# Altium footprint library 螺母.PcbLib: 137 footprints (part 9 of 9)
Each footprint in its own frame and in the unit in brackets; x right, y up, seen from the top. Pads: shape width x height; smd on the part's side, far side on the other; paste and mask are expansions set on the pad; w line width, h text height; cw(c..) or ccw(c..) is an arc to the next point about the centre after c.
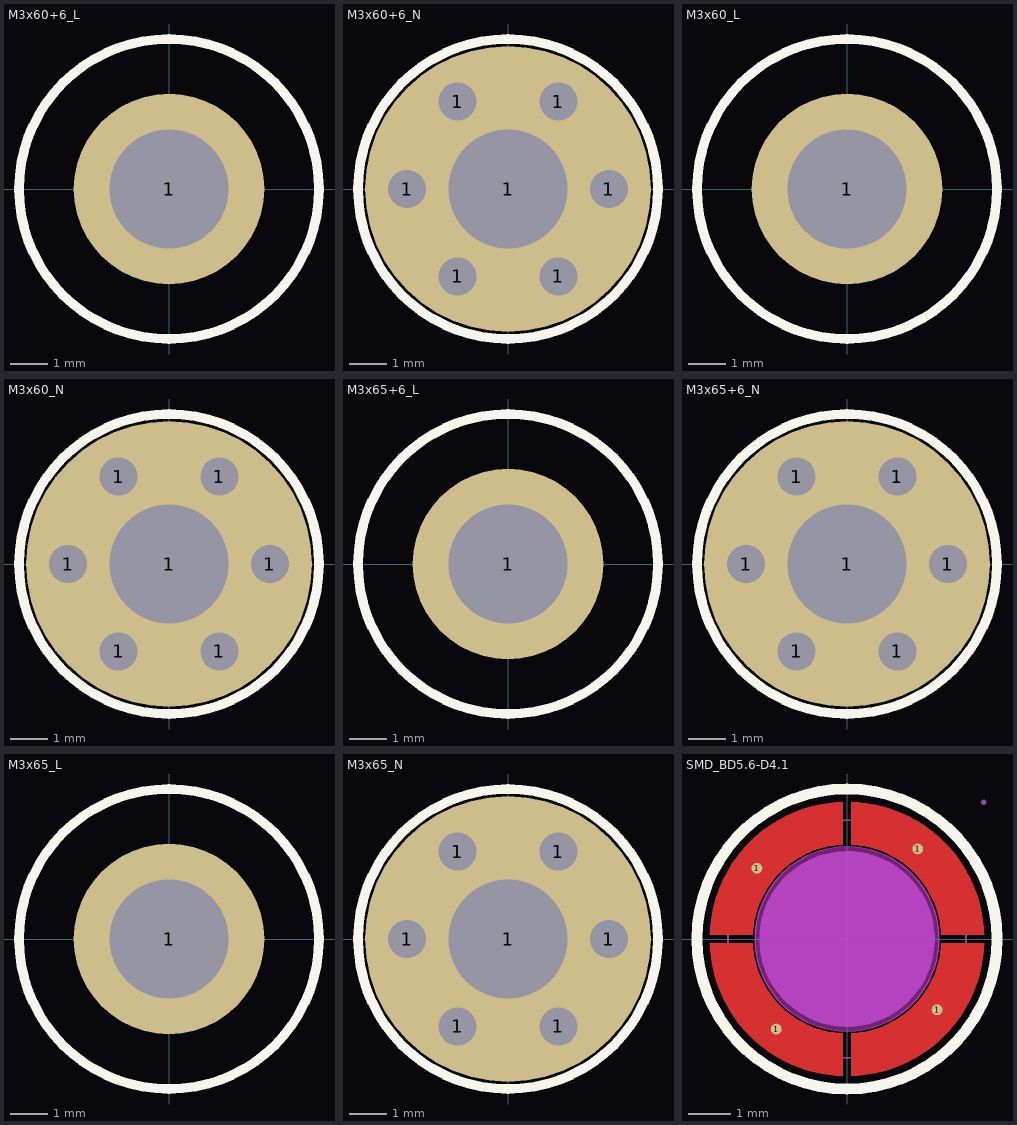
[diagram p8: the footprints below, top view; thin cyan lines are the x and y axes]

## M3x60+6_L [mil] "M3铜柱，长：60mm，螺纹长：6mm"
pads (1):
  round 200 hole 125: 1(0,0)
Top Overlay:
  circle w10: c0,0 r157.48
3D body "M3x60+6.STEP": height 2364.18, standoff -234.25, extent -106.22,-92.52 106.22,92.52

## M3x60+6_N [mil] "M3铜柱，长：60mm，螺纹长：6mm"
pads (7):
  round 40 hole 40: 1(-106,0) 1(-53,-91.8) 1(-53,91.8) 1(53,-91.8) 1(53,91.8) 1(106,0)
  round 300 hole 125: 1(0,0)
Top Overlay:
  circle w10: c0,0 r157.48
3D body "M3x60+6.STEP": height 2364.18, standoff -234.25, extent -106.22,-92.52 106.22,92.52

## M3x60_L [mil] "M3铜柱，长：60mm"
pads (1):
  round 200 hole 125: 1(0,0)
Top Overlay:
  circle w10: c0,0 r157.48
3D body "M3x60.STEP": height 2364.18, standoff 1.96, extent -106.22,-92.52 106.22,92.52

## M3x60_N [mil] "M3铜柱，长：60mm"
pads (7):
  round 40 hole 40: 1(-106,0) 1(-53,-91.8) 1(-53,91.8) 1(53,-91.8) 1(53,91.8) 1(106,0)
  round 300 hole 125: 1(0,0)
Top Overlay:
  circle w10: c0,0 r157.48
3D body "M3x60.STEP": height 2364.18, standoff 1.96, extent -106.22,-92.52 106.22,92.52

## M3x65+6_L [mil] "M3铜柱，长：65mm，螺纹长：6mm"
pads (1):
  round 200 hole 125: 1(0,0)
Top Overlay:
  circle w10: c0,0 r157.48
3D body "M3x65+6.STEP": height 2561.03, standoff -234.25, extent -106.22,-92.52 106.22,92.52

## M3x65+6_N [mil] "M3铜柱，长：65mm，螺纹长：6mm"
pads (7):
  round 40 hole 40: 1(-106,0) 1(-53,-91.8) 1(-53,91.8) 1(53,-91.8) 1(53,91.8) 1(106,0)
  round 300 hole 125: 1(0,0)
Top Overlay:
  circle w10: c0,0 r157.48
3D body "M3x65+6.STEP": height 2561.03, standoff -234.25, extent -106.22,-92.52 106.22,92.52

## M3x65_L [mil] "M3铜柱，长：65mm"
pads (1):
  round 200 hole 125: 1(0,0)
Top Overlay:
  circle w10: c0,0 r157.48
3D body "M3x65.STEP": height 2561.03, standoff 1.96, extent -106.22,-92.52 106.22,92.52

## M3x65_N [mil] "M3铜柱，长：65mm"
pads (7):
  round 40 hole 40: 1(-106,0) 1(-53,-91.8) 1(-53,91.8) 1(53,-91.8) 1(53,91.8) 1(106,0)
  round 300 hole 125: 1(0,0)
Top Overlay:
  circle w10: c0,0 r157.48
3D body "M3x65.STEP": height 2561.03, standoff 1.96, extent -106.22,-92.52 106.22,92.52

## SMD_BD5.6-D4.1 [mil]
pads (4):
  round 10 smd: 1(-82.75,64.96) 1(-64.96,-82.75) 1(64.96,82.75) 1(82.75,-64.96)
Top Layer:
  region: 3.94,-125.98 3.94,-86.61 6.61,-86.45 9.27,-86.21 11.92,-85.89 14.57,-85.48 17.2,-84.99 19.81,-84.42 22.4,-83.78 24.97,-83.05 27.52,-82.24 30.05,-81.35 32.54,-80.39 35,-79.35 37.43,-78.23 39.83,-77.04 42.18,-75.78 44.5,-74.44 46.77,-73.04 49,-71.56 51.19,-70.02 53.32,-68.41 55.4,-66.73 57.44,-64.99 59.41,-63.19 61.33,-61.33 63.19,-59.41 64.99,-57.44 66.73,-55.4 68.41,-53.32 70.02,-51.19 71.56,-49 73.04,-46.77 74.44,-44.5 75.78,-42.18 77.04,-39.83 78.23,-37.43 79.35,-35 80.39,-32.54 81.35,-30.05 82.24,-27.52 83.05,-24.97 83.78,-22.4 84.42,-19.81 84.99,-17.2 85.48,-14.57 85.89,-11.92 86.21,-9.27 86.45,-6.61 86.61,-3.94 125.98,-3.94 125.84,-7.16 125.62,-10.37 125.32,-13.58 124.93,-16.78 124.46,-19.97 123.91,-23.14 123.28,-26.3 122.57,-29.45 121.78,-32.57 120.91,-35.67 119.95,-38.75 118.93,-41.81 117.82,-44.83 116.64,-47.83 115.38,-50.8 114.04,-53.73 112.63,-56.63 111.15,-59.49 109.59,-62.31 107.96,-65.09 106.26,-67.83 104.5,-70.52 102.66,-73.17 100.76,-75.77 98.79,-78.32 96.75,-80.82 94.66,-83.27 92.5,-85.66 90.28,-88 88,-90.28 85.66,-92.5 83.27,-94.66 80.82,-96.75 78.32,-98.79 75.77,-100.76 73.17,-102.66 70.52,-104.5 67.83,-106.26 65.09,-107.96 62.31,-109.59 59.49,-111.15 56.63,-112.63 53.73,-114.04 50.8,-115.38 47.83,-116.64 44.83,-117.82 41.81,-118.93 38.75,-119.95 35.67,-120.91 32.57,-121.78 29.45,-122.57 26.3,-123.28 23.14,-123.91 19.97,-124.46 16.78,-124.93 13.58,-125.32 10.37,-125.62 7.16,-125.84
  region: -125.98,-3.94 -86.61,-3.94 -86.45,-6.61 -86.21,-9.27 -85.89,-11.92 -85.48,-14.57 -84.99,-17.2 -84.42,-19.81 -83.78,-22.4 -83.05,-24.97 -82.24,-27.52 -81.35,-30.05 -80.39,-32.54 -79.35,-35 -78.23,-37.43 -77.04,-39.83 -75.78,-42.18 -74.44,-44.5 -73.04,-46.77 -71.56,-49 -70.02,-51.19 -68.41,-53.32 -66.73,-55.4 -64.99,-57.44 -63.19,-59.41 -61.33,-61.33 -59.41,-63.19 -57.44,-64.99 -55.4,-66.73 -53.32,-68.41 -51.19,-70.02 -49,-71.56 -46.77,-73.04 -44.5,-74.44 -42.18,-75.78 -39.83,-77.04 -37.43,-78.23 -35,-79.35 -32.54,-80.39 -30.05,-81.35 -27.52,-82.24 -24.97,-83.05 -22.4,-83.78 -19.81,-84.42 -17.2,-84.99 -14.57,-85.48 -11.92,-85.89 -9.27,-86.21 -6.61,-86.45 -3.94,-86.61 -3.94,-125.98 -7.16,-125.84 -10.37,-125.62 -13.58,-125.32 -16.78,-124.93 -19.97,-124.46 -23.14,-123.91 -26.3,-123.28 -29.45,-122.57 -32.57,-121.78 -35.67,-120.91 -38.75,-119.95 -41.81,-118.93 -44.83,-117.82 -47.83,-116.64 -50.8,-115.38 -53.73,-114.04 -56.63,-112.63 -59.49,-111.15 -62.31,-109.59 -65.09,-107.96 -67.83,-106.26 -70.52,-104.5 -73.17,-102.66 -75.77,-100.76 -78.32,-98.79 -80.82,-96.75 -83.27,-94.66 -85.66,-92.5 -88,-90.28 -90.28,-88 -92.5,-85.66 -94.66,-83.27 -96.75,-80.82 -98.79,-78.32 -100.76,-75.77 -102.66,-73.17 -104.5,-70.52 -106.26,-67.83 -107.96,-65.09 -109.59,-62.31 -111.15,-59.49 -112.63,-56.63 -114.04,-53.73 -115.38,-50.8 -116.64,-47.83 -117.82,-44.83 -118.93,-41.81 -119.95,-38.75 -120.91,-35.67 -121.78,-32.57 -122.57,-29.45 -123.28,-26.3 -123.91,-23.14 -124.46,-19.97 -124.93,-16.78 -125.32,-13.58 -125.62,-10.37 -125.84,-7.16
  region: -3.94,125.98 -3.94,86.61 -6.61,86.45 -9.27,86.21 -11.92,85.89 -14.57,85.48 -17.2,84.99 -19.81,84.42 -22.4,83.78 -24.97,83.05 -27.52,82.24 -30.05,81.35 -32.54,80.39 -35,79.35 -37.43,78.23 -39.83,77.04 -42.18,75.78 -44.5,74.44 -46.77,73.04 -49,71.56 -51.19,70.02 -53.32,68.41 -55.4,66.73 -57.44,64.99 -59.41,63.19 -61.33,61.33 -63.19,59.41 -64.99,57.44 -66.73,55.4 -68.41,53.32 -70.02,51.19 -71.56,49 -73.04,46.77 -74.44,44.5 -75.78,42.18 -77.04,39.83 -78.23,37.43 -79.35,35 -80.39,32.54 -81.35,30.05 -82.24,27.52 -83.05,24.97 -83.78,22.4 -84.42,19.81 -84.99,17.2 -85.48,14.57 -85.89,11.92 -86.21,9.27 -86.45,6.61 -86.61,3.94 -125.98,3.94 -125.84,7.16 -125.62,10.37 -125.32,13.58 -124.93,16.78 -124.46,19.97 -123.91,23.14 -123.28,26.3 -122.57,29.45 -121.78,32.57 -120.91,35.67 -119.95,38.75 -118.93,41.81 -117.82,44.83 -116.64,47.83 -115.38,50.8 -114.04,53.73 -112.63,56.63 -111.15,59.49 -109.59,62.31 -107.96,65.09 -106.26,67.83 -104.5,70.52 -102.66,73.17 -100.76,75.77 -98.79,78.32 -96.75,80.82 -94.66,83.27 -92.5,85.66 -90.28,88 -88,90.28 -85.66,92.5 -83.27,94.66 -80.82,96.75 -78.32,98.79 -75.77,100.76 -73.17,102.66 -70.52,104.5 -67.83,106.26 -65.09,107.96 -62.31,109.59 -59.49,111.15 -56.63,112.63 -53.73,114.04 -50.8,115.38 -47.83,116.64 -44.83,117.82 -41.81,118.93 -38.75,119.95 -35.67,120.91 -32.57,121.78 -29.45,122.57 -26.3,123.28 -23.14,123.91 -19.97,124.46 -16.78,124.93 -13.58,125.32 -10.37,125.62 -7.16,125.84
  region: 125.98,3.94 86.61,3.94 86.45,6.61 86.21,9.27 85.89,11.92 85.48,14.57 84.99,17.2 84.42,19.81 83.78,22.4 83.05,24.97 82.24,27.52 81.35,30.05 80.39,32.54 79.35,35 78.23,37.43 77.04,39.83 75.78,42.18 74.44,44.5 73.04,46.77 71.56,49 70.02,51.19 68.41,53.32 66.73,55.4 64.99,57.44 63.19,59.41 61.33,61.33 59.41,63.19 57.44,64.99 55.4,66.73 53.32,68.41 51.19,70.02 49,71.56 46.77,73.04 44.5,74.44 42.18,75.78 39.83,77.04 37.43,78.23 35,79.35 32.54,80.39 30.05,81.35 27.52,82.24 24.97,83.05 22.4,83.78 19.81,84.42 17.2,84.99 14.57,85.48 11.92,85.89 9.27,86.21 6.61,86.45 3.94,86.61 3.94,125.98 7.16,125.84 10.37,125.62 13.58,125.32 16.78,124.93 19.97,124.46 23.14,123.91 26.3,123.28 29.45,122.57 32.57,121.78 35.67,120.91 38.75,119.95 41.81,118.93 44.83,117.82 47.83,116.64 50.8,115.38 53.73,114.04 56.63,112.63 59.49,111.15 62.31,109.59 65.09,107.96 67.83,106.26 70.52,104.5 73.17,102.66 75.77,100.76 78.32,98.79 80.82,96.75 83.27,94.66 85.66,92.5 88,90.28 90.28,88 92.5,85.66 94.66,83.27 96.75,80.82 98.79,78.32 100.76,75.77 102.66,73.17 104.5,70.52 106.26,67.83 107.96,65.09 109.59,62.31 111.15,59.49 112.63,56.63 114.04,53.73 115.38,50.8 116.64,47.83 117.82,44.83 118.93,41.81 119.95,38.75 120.91,35.67 121.78,32.57 122.57,29.45 123.28,26.3 123.91,23.14 124.46,19.97 124.93,16.78 125.32,13.58 125.62,10.37 125.84,7.16
Top Overlay:
  circle w10: c0,0 r137.8
Keep-Out Layer:
  board cut-out: 84.65,0 84.65,8.34 81.39,24.69 75.01,40.1 65.75,53.96 53.96,65.75 40.09,75.01 24.69,81.39 8.33,84.65 -8.34,84.65 -24.69,81.39 -40.1,75.01 -53.96,65.75 -65.75,53.96 -75.02,40.09 -81.4,24.69 -84.65,8.34 -84.65,0 -84.65,-8.34 -81.4,-24.69 -75.02,-40.1 -65.75,-53.96 -53.96,-65.75 -40.1,-75.01 -24.69,-81.4 -8.34,-84.65 8.34,-84.65 24.69,-81.4 40.09,-75.01 53.96,-65.75 65.75,-53.96 75.01,-40.1 81.39,-24.69 84.65,-8.34 84.65,0
Mechanical 1:
  circle w0.2: c0,0 r84.65
Mechanical 6:
  circle w80.71: c0,0 r40.35
Mechanical 15:
  region: -125.59,5.91 -125.19,11.81 -124.01,20.87 -122.83,26.77 -119.29,39.37 -112.99,55.51 -104.33,70.87 -93.31,84.25 -79.13,98.43 -62.6,109.06 -53.94,113.39 -42.91,118.11 -21.26,124.02 -5.9,125.59 -5.9,94.09 -18.9,92.13 -37.79,87.01 -46.45,81.5 -59.84,72.84 -73.23,60.24 -83.46,43.7 -88.19,33.47 -92.91,17.72 -94.09,5.91
  region: -5.91,-125.59 -11.81,-125.2 -20.87,-124.02 -26.77,-122.83 -39.37,-119.29 -55.51,-112.99 -70.87,-104.33 -84.25,-93.31 -98.42,-79.13 -109.06,-62.6 -113.39,-53.94 -118.11,-42.91 -124.02,-21.26 -125.59,-5.91 -94.09,-5.91 -92.13,-18.9 -87.01,-37.8 -81.5,-46.46 -72.83,-59.84 -60.24,-73.23 -43.7,-83.46 -33.47,-88.19 -17.72,-92.91 -5.91,-94.09
  region: 125.59,-5.91 125.2,-11.81 124.02,-20.87 122.83,-26.77 119.29,-39.37 112.99,-55.51 104.33,-70.87 93.31,-84.25 79.13,-98.42 62.6,-109.06 53.94,-113.39 42.91,-118.11 21.26,-124.02 5.91,-125.59 5.91,-94.09 18.9,-92.13 37.8,-87.01 46.46,-81.5 59.84,-72.83 73.23,-60.24 83.46,-43.7 88.19,-33.47 92.91,-17.72 94.09,-5.91
  region: 5.91,125.59 11.81,125.2 20.87,124.02 26.77,122.83 39.37,119.29 55.51,112.99 70.87,104.33 84.25,93.31 98.42,79.13 109.06,62.6 113.39,53.94 118.11,42.91 124.02,21.26 125.59,5.91 94.09,5.91 92.13,18.9 87.01,37.8 81.5,46.46 72.83,59.84 60.24,73.23 43.7,83.46 33.47,88.19 17.72,92.91 5.91,94.09
  region: 127.95,125.59 127.93,126.55 126.55,127.9 124.63,127.9 123.25,126.55 123.23,125.59 123.25,124.63 124.63,123.28 126.55,123.28 127.93,124.63
  lines w2: -109.45,0 cw(c0,0) 0,109.45 cw(c0,0) 109.45,0 cw(c0,0) 0,-109.45 cw(c0,0) -109.45,0
Multi-Layer keep-out:
  region: 84.65,0 84.65,8.34 81.39,24.69 75.01,40.1 65.75,53.96 53.96,65.75 40.09,75.01 24.69,81.39 8.33,84.65 -8.34,84.65 -24.69,81.39 -40.1,75.01 -53.96,65.75 -65.75,53.96 -75.02,40.09 -81.4,24.69 -84.65,8.34 -84.65,0 -84.65,-8.34 -81.4,-24.69 -75.02,-40.1 -65.75,-53.96 -53.96,-65.75 -40.1,-75.01 -24.69,-81.4 -8.34,-84.65 8.34,-84.65 24.69,-81.4 40.09,-75.01 53.96,-65.75 65.75,-53.96 75.01,-40.1 81.39,-24.69 84.65,-8.34 84.65,0
3D body "U1.step": height 118.5, standoff -59.84, extent -109.45,-108.98 109.84,108.98